# Altium footprint library Connector_Samtec_HLE_THT.PcbLib: 141 footprints (part 2 of 9)
Each footprint in its own frame and in the unit in brackets; x right, y up, seen from the top. Pads: shape width x height; smd on the part's side, far side on the other; paste and mask are expansions set on the pad; w line width, h text height; cw(c..) or ccw(c..) is an arc to the next point about the centre after c.
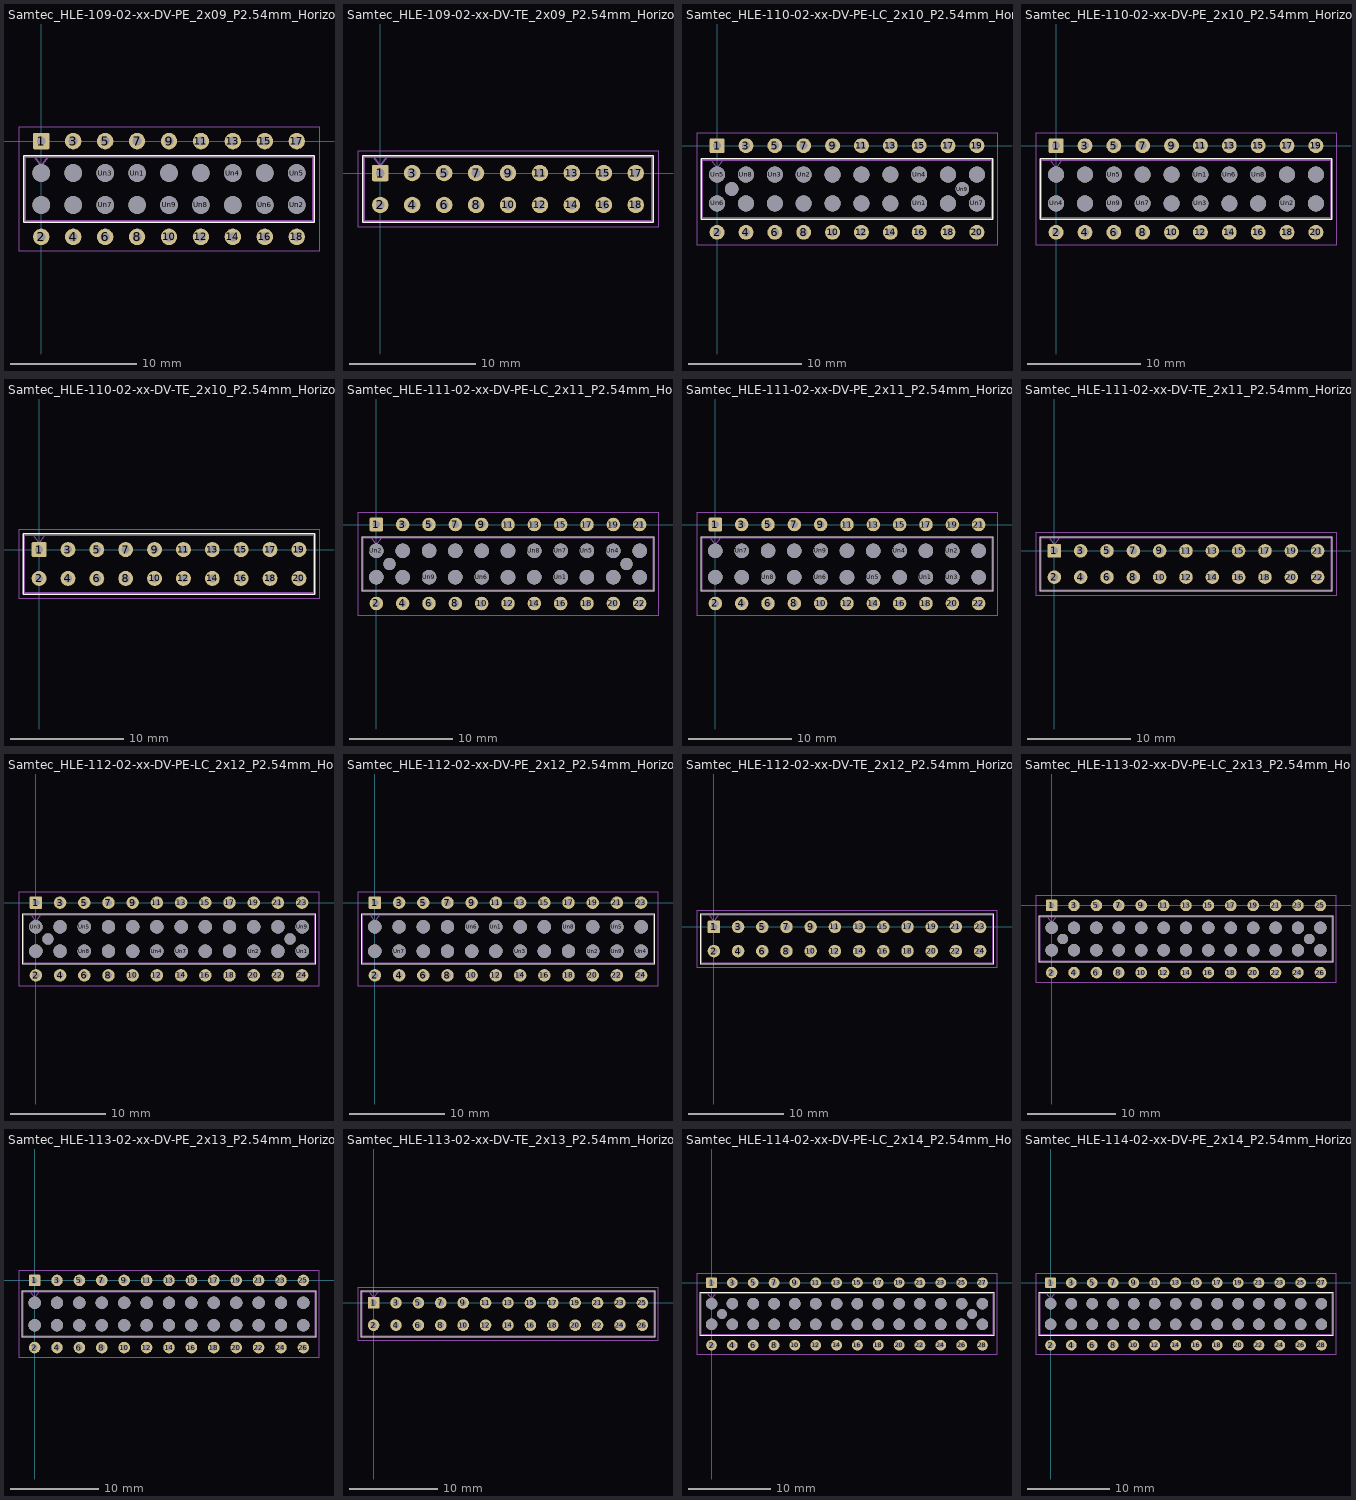
[diagram p1: the footprints below, top view; thin cyan lines are the x and y axes]

## Samtec_HLE-109-02-xx-DV-PE_2x09_P2.54mm_Horizontal [mm]
pads (36):
  rrect19% 1.31x1.31 hole 0.71: 1(0,0)
  round 1.31 hole 0.71: 2(0,-7.62) 3(2.54,0) 4(2.54,-7.62) 5(5.08,0) 6(5.08,-7.62) 7(7.62,0) 8(7.62,-7.62) 9(10.16,0) 10(10.16,-7.62) 11(12.7,0) 12(12.7,-7.62) 13(15.24,0) 14(15.24,-7.62) 15(17.78,0) 16(17.78,-7.62) 17(20.32,0) 18(20.32,-7.62)
  round 1.4 hole 1.4: Un1(7.62,-2.54) Un2(20.32,-5.08) Un3(5.08,-2.54) Un4(15.24,-2.54) Un5(20.32,-2.54) Un6(17.78,-5.08) Un7(5.08,-5.08) Un8(12.7,-5.08) Un9(10.16,-5.08) Un10(17.78,-2.54) Un11(2.54,-5.08) Un12(7.62,-5.08) Un13(2.54,-2.54) Un14(10.16,-2.54) Un15(12.7,-2.54) Un16(0,-2.54) Un17(0,-5.08) Un18(15.24,-5.08)
F.SilkS:
  lines w0.12: -1.38,-6.46 -1.38,-1.16 21.7,-1.16 21.7,-6.46 -1.38,-6.46
F.CrtYd:
  lines w0.05: -1.77,-8.78 22.09,-8.78 22.09,1.16 -1.77,1.16 -1.77,-8.78
F.Fab:
  lines w0.1: -0.5,-1.27 0,-1.977 0.5,-1.27 ; -1.27,-6.35 -1.27,-1.27 21.59,-1.27 21.59,-6.35 -1.27,-6.35
  text "'.Designator'" at 6.113,-6.49 h1

## Samtec_HLE-109-02-xx-DV-TE_2x09_P2.54mm_Horizontal [mm]
pads (18):
  rrect19% 1.31x1.31 hole 0.71: 1(0,0)
  round 1.31 hole 0.71: 2(0,-2.54) 3(2.54,0) 4(2.54,-2.54) 5(5.08,0) 6(5.08,-2.54) 7(7.62,0) 8(7.62,-2.54) 9(10.16,0) 10(10.16,-2.54) 11(12.7,0) 12(12.7,-2.54) 13(15.24,0) 14(15.24,-2.54) 15(17.78,0) 16(17.78,-2.54) 17(20.32,0) 18(20.32,-2.54)
F.SilkS:
  lines w0.12: -1.38,-3.92 21.7,-3.92 21.7,1.38 -1.38,1.38 -1.38,-3.92
F.CrtYd:
  lines w0.05: -1.77,-4.31 22.09,-4.31 22.09,1.77 -1.77,1.77 -1.77,-4.31
F.Fab:
  lines w0.1: -0.5,1.27 0,0.563 0.5,1.27 ; -1.27,-3.81 -1.27,1.27 21.59,1.27 21.59,-3.81 -1.27,-3.81
  text "'.Designator'" at 6.113,-3.95 h1

## Samtec_HLE-110-02-xx-DV-PE-LC_2x10_P2.54mm_Horizontal [mm]
pads (42):
  rrect19% 1.31x1.31 hole 0.71: 1(0,0)
  round 1.31 hole 0.71: 2(0,-7.62) 3(2.54,0) 4(2.54,-7.62) 5(5.08,0) 6(5.08,-7.62) 7(7.62,0) 8(7.62,-7.62) 9(10.16,0) 10(10.16,-7.62) 11(12.7,0) 12(12.7,-7.62) 13(15.24,0) 14(15.24,-7.62) 15(17.78,0) 16(17.78,-7.62) 17(20.32,0) 18(20.32,-7.62) 19(22.86,0) 20(22.86,-7.62)
  round 1.4 hole 1.4: Un1(17.78,-5.08) Un2(7.62,-2.54) Un3(5.08,-2.54) Un4(17.78,-2.54) Un5(0,-2.54) Un6(0,-5.08) Un7(22.86,-5.08) Un8(2.54,-2.54) Un10(12.7,-5.08) Un11(20.32,-2.54) Un12(20.32,-5.08) Un13(22.86,-2.54) Un14(10.16,-2.54) Un16(5.08,-5.08) Un17(15.24,-5.08) Un18(15.24,-2.54) Un19(7.62,-5.08) Un20(2.54,-5.08) Un21(12.7,-2.54) Un22(10.16,-5.08)
  round 1.19 hole 1.19: Un9(21.59,-3.81) Un15(1.27,-3.81)
F.SilkS:
  lines w0.12: -1.38,-6.46 -1.38,-1.16 24.24,-1.16 24.24,-6.46 -1.38,-6.46
F.CrtYd:
  lines w0.05: -1.77,-8.78 -1.77,1.16 24.63,1.16 24.63,-8.78 -1.77,-8.78
F.Fab:
  lines w0.1: -0.5,-1.27 0,-1.977 0.5,-1.27 ; -1.27,-6.35 24.13,-6.35 24.13,-1.27 -1.27,-1.27 -1.27,-6.35
  text "'.Designator'" at 7.383,-6.49 h1

## Samtec_HLE-110-02-xx-DV-PE_2x10_P2.54mm_Horizontal [mm]
pads (40):
  rrect19% 1.31x1.31 hole 0.71: 1(0,0)
  round 1.31 hole 0.71: 2(0,-7.62) 3(2.54,0) 4(2.54,-7.62) 5(5.08,0) 6(5.08,-7.62) 7(7.62,0) 8(7.62,-7.62) 9(10.16,0) 10(10.16,-7.62) 11(12.7,0) 12(12.7,-7.62) 13(15.24,0) 14(15.24,-7.62) 15(17.78,0) 16(17.78,-7.62) 17(20.32,0) 18(20.32,-7.62) 19(22.86,0) 20(22.86,-7.62)
  round 1.4 hole 1.4: Un1(12.7,-2.54) Un2(20.32,-5.08) Un3(12.7,-5.08) Un4(0,-5.08) Un5(5.08,-2.54) Un6(15.24,-2.54) Un7(7.62,-5.08) Un8(17.78,-2.54) Un9(5.08,-5.08) Un10(10.16,-5.08) Un11(7.62,-2.54) Un12(22.86,-2.54) Un13(22.86,-5.08) Un14(0,-2.54) Un15(17.78,-5.08) Un16(15.24,-5.08) Un17(20.32,-2.54) Un18(10.16,-2.54) Un19(2.54,-2.54) Un20(2.54,-5.08)
F.SilkS:
  lines w0.12: -1.38,-6.46 -1.38,-1.16 24.24,-1.16 24.24,-6.46 -1.38,-6.46
F.CrtYd:
  lines w0.05: -1.77,-8.78 -1.77,1.16 24.63,1.16 24.63,-8.78 -1.77,-8.78
F.Fab:
  lines w0.1: -0.5,-1.27 0,-1.977 0.5,-1.27 ; -1.27,-6.35 24.13,-6.35 24.13,-1.27 -1.27,-1.27 -1.27,-6.35
  text "'.Designator'" at 7.383,-6.49 h1

## Samtec_HLE-110-02-xx-DV-TE_2x10_P2.54mm_Horizontal [mm]
pads (20):
  rrect19% 1.31x1.31 hole 0.71: 1(0,0)
  round 1.31 hole 0.71: 2(0,-2.54) 3(2.54,0) 4(2.54,-2.54) 5(5.08,0) 6(5.08,-2.54) 7(7.62,0) 8(7.62,-2.54) 9(10.16,0) 10(10.16,-2.54) 11(12.7,0) 12(12.7,-2.54) 13(15.24,0) 14(15.24,-2.54) 15(17.78,0) 16(17.78,-2.54) 17(20.32,0) 18(20.32,-2.54) 19(22.86,0) 20(22.86,-2.54)
F.SilkS:
  lines w0.12: -1.38,-3.92 24.24,-3.92 24.24,1.38 -1.38,1.38 -1.38,-3.92
F.CrtYd:
  lines w0.05: -1.77,-4.31 -1.77,1.77 24.63,1.77 24.63,-4.31 -1.77,-4.31
F.Fab:
  lines w0.1: -0.5,1.27 0,0.563 0.5,1.27 ; -1.27,-3.81 -1.27,1.27 24.13,1.27 24.13,-3.81 -1.27,-3.81
  text "'.Designator'" at 7.383,-3.95 h1

## Samtec_HLE-111-02-xx-DV-PE-LC_2x11_P2.54mm_Horizontal [mm]
pads (46):
  rrect19% 1.31x1.31 hole 0.71: 1(0,0)
  round 1.31 hole 0.71: 2(0,-7.62) 3(2.54,0) 4(2.54,-7.62) 5(5.08,0) 6(5.08,-7.62) 7(7.62,0) 8(7.62,-7.62) 9(10.16,0) 10(10.16,-7.62) 11(12.7,0) 12(12.7,-7.62) 13(15.24,0) 14(15.24,-7.62) 15(17.78,0) 16(17.78,-7.62) 17(20.32,0) 18(20.32,-7.62) 19(22.86,0) 20(22.86,-7.62) 21(25.4,0) 22(25.4,-7.62)
  round 1.4 hole 1.4: Un1(17.78,-5.08) Un2(0,-2.54) Un4(22.86,-2.54) Un5(20.32,-2.54) Un6(10.16,-5.08) Un7(17.78,-2.54) Un8(15.24,-2.54) Un9(5.08,-5.08) Un10(0,-5.08) Un12(25.4,-5.08) Un13(12.7,-2.54) Un14(22.86,-5.08) Un15(25.4,-2.54) Un16(5.08,-2.54) Un17(2.54,-5.08) Un18(12.7,-5.08) Un19(10.16,-2.54) Un20(7.62,-2.54) Un21(7.62,-5.08) Un22(15.24,-5.08) Un23(20.32,-5.08) Un24(2.54,-2.54)
  round 1.19 hole 1.19: Un3(24.13,-3.81) Un11(1.27,-3.81)
F.SilkS:
  lines w0.12: -1.38,-6.46 26.78,-6.46 26.78,-1.16 -1.38,-1.16 -1.38,-6.46
F.CrtYd:
  lines w0.05: -1.77,-8.78 -1.77,1.16 27.17,1.16 27.17,-8.78 -1.77,-8.78
F.Fab:
  lines w0.1: -0.5,-1.27 0,-1.977 0.5,-1.27 ; -1.27,-6.35 -1.27,-1.27 26.67,-1.27 26.67,-6.35 -1.27,-6.35
  text "'.Designator'" at 8.653,-6.49 h1

## Samtec_HLE-111-02-xx-DV-PE_2x11_P2.54mm_Horizontal [mm]
pads (44):
  rrect19% 1.31x1.31 hole 0.71: 1(0,0)
  round 1.31 hole 0.71: 2(0,-7.62) 3(2.54,0) 4(2.54,-7.62) 5(5.08,0) 6(5.08,-7.62) 7(7.62,0) 8(7.62,-7.62) 9(10.16,0) 10(10.16,-7.62) 11(12.7,0) 12(12.7,-7.62) 13(15.24,0) 14(15.24,-7.62) 15(17.78,0) 16(17.78,-7.62) 17(20.32,0) 18(20.32,-7.62) 19(22.86,0) 20(22.86,-7.62) 21(25.4,0) 22(25.4,-7.62)
  round 1.4 hole 1.4: Un1(20.32,-5.08) Un2(22.86,-2.54) Un3(22.86,-5.08) Un4(17.78,-2.54) Un5(15.24,-5.08) Un6(10.16,-5.08) Un7(2.54,-2.54) Un8(5.08,-5.08) Un9(10.16,-2.54) Un10(7.62,-5.08) Un11(7.62,-2.54) Un12(0,-2.54) Un13(2.54,-5.08) Un14(12.7,-2.54) Un15(5.08,-2.54) Un16(12.7,-5.08) Un17(0,-5.08) Un18(25.4,-2.54) Un19(15.24,-2.54) Un20(20.32,-2.54) Un21(17.78,-5.08) Un22(25.4,-5.08)
F.SilkS:
  lines w0.12: -1.38,-6.46 -1.38,-1.16 26.78,-1.16 26.78,-6.46 -1.38,-6.46
F.CrtYd:
  lines w0.05: -1.77,-8.78 27.17,-8.78 27.17,1.16 -1.77,1.16 -1.77,-8.78
F.Fab:
  lines w0.1: -0.5,-1.27 0,-1.977 0.5,-1.27 ; -1.27,-6.35 -1.27,-1.27 26.67,-1.27 26.67,-6.35 -1.27,-6.35
  text "'.Designator'" at 8.653,-6.49 h1

## Samtec_HLE-111-02-xx-DV-TE_2x11_P2.54mm_Horizontal [mm]
pads (22):
  rrect19% 1.31x1.31 hole 0.71: 1(0,0)
  round 1.31 hole 0.71: 2(0,-2.54) 3(2.54,0) 4(2.54,-2.54) 5(5.08,0) 6(5.08,-2.54) 7(7.62,0) 8(7.62,-2.54) 9(10.16,0) 10(10.16,-2.54) 11(12.7,0) 12(12.7,-2.54) 13(15.24,0) 14(15.24,-2.54) 15(17.78,0) 16(17.78,-2.54) 17(20.32,0) 18(20.32,-2.54) 19(22.86,0) 20(22.86,-2.54) 21(25.4,0) 22(25.4,-2.54)
F.SilkS:
  lines w0.12: -1.38,-3.92 -1.38,1.38 26.78,1.38 26.78,-3.92 -1.38,-3.92
F.CrtYd:
  lines w0.05: -1.77,-4.31 27.17,-4.31 27.17,1.77 -1.77,1.77 -1.77,-4.31
F.Fab:
  lines w0.1: -0.5,1.27 0,0.563 0.5,1.27 ; -1.27,-3.81 -1.27,1.27 26.67,1.27 26.67,-3.81 -1.27,-3.81
  text "'.Designator'" at 8.653,-3.95 h1

## Samtec_HLE-112-02-xx-DV-PE-LC_2x12_P2.54mm_Horizontal [mm]
pads (50):
  rrect19% 1.31x1.31 hole 0.71: 1(0,0)
  round 1.31 hole 0.71: 2(0,-7.62) 3(2.54,0) 4(2.54,-7.62) 5(5.08,0) 6(5.08,-7.62) 7(7.62,0) 8(7.62,-7.62) 9(10.16,0) 10(10.16,-7.62) 11(12.7,0) 12(12.7,-7.62) 13(15.24,0) 14(15.24,-7.62) 15(17.78,0) 16(17.78,-7.62) 17(20.32,0) 18(20.32,-7.62) 19(22.86,0) 20(22.86,-7.62) 21(25.4,0) 22(25.4,-7.62) 23(27.94,0) 24(27.94,-7.62)
  round 1.4 hole 1.4: Un1(27.94,-5.08) Un2(22.86,-5.08) Un3(0,-2.54) Un4(12.7,-5.08) Un5(5.08,-2.54) Un7(15.24,-5.08) Un8(5.08,-5.08) Un9(27.94,-2.54) Un10(7.62,-5.08) Un11(0,-5.08) Un12(25.4,-5.08) Un14(2.54,-2.54) Un15(20.32,-5.08) Un16(17.78,-5.08) Un17(2.54,-5.08) Un18(7.62,-2.54) Un19(25.4,-2.54) Un20(10.16,-2.54) Un21(12.7,-2.54) Un22(15.24,-2.54) Un23(17.78,-2.54) Un24(10.16,-5.08) Un25(20.32,-2.54) Un26(22.86,-2.54)
  round 1.19 hole 1.19: Un6(26.67,-3.81) Un13(1.27,-3.81)
F.SilkS:
  lines w0.12: -1.38,-6.46 29.32,-6.46 29.32,-1.16 -1.38,-1.16 -1.38,-6.46
F.CrtYd:
  lines w0.05: -1.77,-8.78 -1.77,1.16 29.71,1.16 29.71,-8.78 -1.77,-8.78
F.Fab:
  lines w0.1: -0.5,-1.27 0,-1.977 0.5,-1.27 ; -1.27,-6.35 -1.27,-1.27 29.21,-1.27 29.21,-6.35 -1.27,-6.35
  text "'.Designator'" at 9.923,-6.49 h1

## Samtec_HLE-112-02-xx-DV-PE_2x12_P2.54mm_Horizontal [mm]
pads (48):
  rrect19% 1.31x1.31 hole 0.71: 1(0,0)
  round 1.31 hole 0.71: 2(0,-7.62) 3(2.54,0) 4(2.54,-7.62) 5(5.08,0) 6(5.08,-7.62) 7(7.62,0) 8(7.62,-7.62) 9(10.16,0) 10(10.16,-7.62) 11(12.7,0) 12(12.7,-7.62) 13(15.24,0) 14(15.24,-7.62) 15(17.78,0) 16(17.78,-7.62) 17(20.32,0) 18(20.32,-7.62) 19(22.86,0) 20(22.86,-7.62) 21(25.4,0) 22(25.4,-7.62) 23(27.94,0) 24(27.94,-7.62)
  round 1.4 hole 1.4: Un1(12.7,-2.54) Un2(22.86,-5.08) Un3(15.24,-5.08) Un4(27.94,-5.08) Un5(25.4,-2.54) Un6(10.16,-2.54) Un7(2.54,-5.08) Un8(20.32,-2.54) Un9(25.4,-5.08) Un10(5.08,-5.08) Un11(10.16,-5.08) Un12(0,-2.54) Un13(0,-5.08) Un14(17.78,-2.54) Un15(27.94,-2.54) Un16(5.08,-2.54) Un17(20.32,-5.08) Un18(7.62,-2.54) Un19(15.24,-2.54) Un20(7.62,-5.08) Un21(22.86,-2.54) Un22(2.54,-2.54) Un23(12.7,-5.08) Un24(17.78,-5.08)
F.SilkS:
  lines w0.12: -1.38,-6.46 -1.38,-1.16 29.32,-1.16 29.32,-6.46 -1.38,-6.46
F.CrtYd:
  lines w0.05: -1.77,-8.78 29.71,-8.78 29.71,1.16 -1.77,1.16 -1.77,-8.78
F.Fab:
  lines w0.1: -0.5,-1.27 0,-1.977 0.5,-1.27 ; -1.27,-6.35 29.21,-6.35 29.21,-1.27 -1.27,-1.27 -1.27,-6.35
  text "'.Designator'" at 9.923,-6.49 h1

## Samtec_HLE-112-02-xx-DV-TE_2x12_P2.54mm_Horizontal [mm]
pads (24):
  rrect19% 1.31x1.31 hole 0.71: 1(0,0)
  round 1.31 hole 0.71: 2(0,-2.54) 3(2.54,0) 4(2.54,-2.54) 5(5.08,0) 6(5.08,-2.54) 7(7.62,0) 8(7.62,-2.54) 9(10.16,0) 10(10.16,-2.54) 11(12.7,0) 12(12.7,-2.54) 13(15.24,0) 14(15.24,-2.54) 15(17.78,0) 16(17.78,-2.54) 17(20.32,0) 18(20.32,-2.54) 19(22.86,0) 20(22.86,-2.54) 21(25.4,0) 22(25.4,-2.54) 23(27.94,0) 24(27.94,-2.54)
F.SilkS:
  lines w0.12: -1.38,-3.92 29.32,-3.92 29.32,1.38 -1.38,1.38 -1.38,-3.92
F.CrtYd:
  lines w0.05: -1.77,-4.31 -1.77,1.77 29.71,1.77 29.71,-4.31 -1.77,-4.31
F.Fab:
  lines w0.1: -0.5,1.27 0,0.563 0.5,1.27 ; -1.27,-3.81 29.21,-3.81 29.21,1.27 -1.27,1.27 -1.27,-3.81
  text "'.Designator'" at 9.923,-3.95 h1

## Samtec_HLE-113-02-xx-DV-PE-LC_2x13_P2.54mm_Horizontal [mm]
pads (54):
  rrect19% 1.31x1.31 hole 0.71: 1(0,0)
  round 1.31 hole 0.71: 2(0,-7.62) 3(2.54,0) 4(2.54,-7.62) 5(5.08,0) 6(5.08,-7.62) 7(7.62,0) 8(7.62,-7.62) 9(10.16,0) 10(10.16,-7.62) 11(12.7,0) 12(12.7,-7.62) 13(15.24,0) 14(15.24,-7.62) 15(17.78,0) 16(17.78,-7.62) 17(20.32,0) 18(20.32,-7.62) 19(22.86,0) 20(22.86,-7.62) 21(25.4,0) 22(25.4,-7.62) 23(27.94,0) 24(27.94,-7.62) 25(30.48,0) 26(30.48,-7.62)
  round 1.19 hole 1.19: Un1(29.21,-3.81) Un22(1.27,-3.81)
  round 1.4 hole 1.4: Un2(25.4,-5.08) Un3(10.16,-2.54) Un4(15.24,-5.08) Un5(5.08,-5.08) Un6(7.62,-5.08) Un7(12.7,-2.54) Un8(22.86,-5.08) Un9(2.54,-2.54) Un10(27.94,-2.54) Un11(0,-2.54) Un12(25.4,-2.54) Un13(30.48,-5.08) Un14(12.7,-5.08) Un15(30.48,-2.54) Un16(17.78,-2.54) Un17(22.86,-2.54) Un18(20.32,-2.54) Un19(7.62,-2.54) Un20(5.08,-2.54) Un21(0,-5.08) Un23(10.16,-5.08) Un24(17.78,-5.08) Un25(2.54,-5.08) Un26(20.32,-5.08) Un27(15.24,-2.54) Un28(27.94,-5.08)
F.SilkS:
  lines w0.12: -1.38,-6.46 31.86,-6.46 31.86,-1.16 -1.38,-1.16 -1.38,-6.46
F.CrtYd:
  lines w0.05: -1.77,-8.78 32.25,-8.78 32.25,1.16 -1.77,1.16 -1.77,-8.78
F.Fab:
  lines w0.1: -0.5,-1.27 0,-1.977 0.5,-1.27 ; -1.27,-6.35 -1.27,-1.27 31.75,-1.27 31.75,-6.35 -1.27,-6.35
  text "'.Designator'" at 11.193,-6.49 h1

## Samtec_HLE-113-02-xx-DV-PE_2x13_P2.54mm_Horizontal [mm]
pads (52):
  rrect19% 1.31x1.31 hole 0.71: 1(0,0)
  round 1.31 hole 0.71: 2(0,-7.62) 3(2.54,0) 4(2.54,-7.62) 5(5.08,0) 6(5.08,-7.62) 7(7.62,0) 8(7.62,-7.62) 9(10.16,0) 10(10.16,-7.62) 11(12.7,0) 12(12.7,-7.62) 13(15.24,0) 14(15.24,-7.62) 15(17.78,0) 16(17.78,-7.62) 17(20.32,0) 18(20.32,-7.62) 19(22.86,0) 20(22.86,-7.62) 21(25.4,0) 22(25.4,-7.62) 23(27.94,0) 24(27.94,-7.62) 25(30.48,0) 26(30.48,-7.62)
  round 1.4 hole 1.4: Un1(5.08,-5.08) Un2(2.54,-2.54) Un3(12.7,-2.54) Un4(15.24,-5.08) Un5(30.48,-5.08) Un6(27.94,-5.08) Un7(12.7,-5.08) Un8(25.4,-5.08) Un9(25.4,-2.54) Un10(0,-5.08) Un11(20.32,-2.54) Un12(15.24,-2.54) Un13(7.62,-2.54) Un14(30.48,-2.54) Un15(17.78,-5.08) Un16(20.32,-5.08) Un17(22.86,-2.54) Un18(10.16,-2.54) Un19(10.16,-5.08) Un20(17.78,-2.54) Un21(27.94,-2.54) Un22(5.08,-2.54) Un23(2.54,-5.08) Un24(0,-2.54) Un25(7.62,-5.08) Un26(22.86,-5.08)
F.SilkS:
  lines w0.12: -1.38,-6.46 -1.38,-1.16 31.86,-1.16 31.86,-6.46 -1.38,-6.46
F.CrtYd:
  lines w0.05: -1.77,-8.78 -1.77,1.16 32.25,1.16 32.25,-8.78 -1.77,-8.78
F.Fab:
  lines w0.1: -0.5,-1.27 0,-1.977 0.5,-1.27 ; -1.27,-6.35 -1.27,-1.27 31.75,-1.27 31.75,-6.35 -1.27,-6.35
  text "'.Designator'" at 11.193,-6.49 h1

## Samtec_HLE-113-02-xx-DV-TE_2x13_P2.54mm_Horizontal [mm]
pads (26):
  rrect19% 1.31x1.31 hole 0.71: 1(0,0)
  round 1.31 hole 0.71: 2(0,-2.54) 3(2.54,0) 4(2.54,-2.54) 5(5.08,0) 6(5.08,-2.54) 7(7.62,0) 8(7.62,-2.54) 9(10.16,0) 10(10.16,-2.54) 11(12.7,0) 12(12.7,-2.54) 13(15.24,0) 14(15.24,-2.54) 15(17.78,0) 16(17.78,-2.54) 17(20.32,0) 18(20.32,-2.54) 19(22.86,0) 20(22.86,-2.54) 21(25.4,0) 22(25.4,-2.54) 23(27.94,0) 24(27.94,-2.54) 25(30.48,0) 26(30.48,-2.54)
F.SilkS:
  lines w0.12: -1.38,-3.92 -1.38,1.38 31.86,1.38 31.86,-3.92 -1.38,-3.92
F.CrtYd:
  lines w0.05: -1.77,-4.31 -1.77,1.77 32.25,1.77 32.25,-4.31 -1.77,-4.31
F.Fab:
  lines w0.1: -0.5,1.27 0,0.563 0.5,1.27 ; -1.27,-3.81 -1.27,1.27 31.75,1.27 31.75,-3.81 -1.27,-3.81
  text "'.Designator'" at 11.193,-3.95 h1

## Samtec_HLE-114-02-xx-DV-PE-LC_2x14_P2.54mm_Horizontal [mm]
pads (58):
  rrect19% 1.31x1.31 hole 0.71: 1(0,0)
  round 1.31 hole 0.71: 2(0,-7.62) 3(2.54,0) 4(2.54,-7.62) 5(5.08,0) 6(5.08,-7.62) 7(7.62,0) 8(7.62,-7.62) 9(10.16,0) 10(10.16,-7.62) 11(12.7,0) 12(12.7,-7.62) 13(15.24,0) 14(15.24,-7.62) 15(17.78,0) 16(17.78,-7.62) 17(20.32,0) 18(20.32,-7.62) 19(22.86,0) 20(22.86,-7.62) 21(25.4,0) 22(25.4,-7.62) 23(27.94,0) 24(27.94,-7.62) 25(30.48,0) 26(30.48,-7.62) 27(33.02,0) 28(33.02,-7.62)
  round 1.4 hole 1.4: Un1(22.86,-2.54) Un2(33.02,-5.08) Un3(12.7,-2.54) Un4(17.78,-5.08) Un5(0,-5.08) Un6(7.62,-2.54) Un8(33.02,-2.54) Un9(22.86,-5.08) Un10(25.4,-5.08) Un11(30.48,-5.08) Un12(15.24,-5.08) Un14(27.94,-5.08) Un15(15.24,-2.54) Un16(2.54,-5.08) Un17(25.4,-2.54) Un18(30.48,-2.54) Un19(5.08,-2.54) Un20(10.16,-2.54) Un21(12.7,-5.08) Un22(7.62,-5.08) Un23(20.32,-5.08) Un24(0,-2.54) Un25(20.32,-2.54) Un26(10.16,-5.08) Un27(17.78,-2.54) Un28(27.94,-2.54) Un29(2.54,-2.54) Un30(5.08,-5.08)
  round 1.19 hole 1.19: Un7(31.75,-3.81) Un13(1.27,-3.81)
F.SilkS:
  lines w0.12: -1.38,-6.46 -1.38,-1.16 34.4,-1.16 34.4,-6.46 -1.38,-6.46
F.CrtYd:
  lines w0.05: -1.77,-8.78 34.79,-8.78 34.79,1.16 -1.77,1.16 -1.77,-8.78
F.Fab:
  lines w0.1: -0.5,-1.27 0,-1.977 0.5,-1.27 ; -1.27,-6.35 34.29,-6.35 34.29,-1.27 -1.27,-1.27 -1.27,-6.35
  text "'.Designator'" at 12.463,-6.49 h1

## Samtec_HLE-114-02-xx-DV-PE_2x14_P2.54mm_Horizontal [mm]
pads (56):
  rrect19% 1.31x1.31 hole 0.71: 1(0,0)
  round 1.31 hole 0.71: 2(0,-7.62) 3(2.54,0) 4(2.54,-7.62) 5(5.08,0) 6(5.08,-7.62) 7(7.62,0) 8(7.62,-7.62) 9(10.16,0) 10(10.16,-7.62) 11(12.7,0) 12(12.7,-7.62) 13(15.24,0) 14(15.24,-7.62) 15(17.78,0) 16(17.78,-7.62) 17(20.32,0) 18(20.32,-7.62) 19(22.86,0) 20(22.86,-7.62) 21(25.4,0) 22(25.4,-7.62) 23(27.94,0) 24(27.94,-7.62) 25(30.48,0) 26(30.48,-7.62) 27(33.02,0) 28(33.02,-7.62)
  round 1.4 hole 1.4: Un1(20.32,-5.08) Un2(12.7,-5.08) Un3(30.48,-5.08) Un4(7.62,-5.08) Un5(33.02,-2.54) Un6(17.78,-2.54) Un7(5.08,-2.54) Un8(33.02,-5.08) Un9(22.86,-2.54) Un10(30.48,-2.54) Un11(2.54,-5.08) Un12(10.16,-2.54) Un13(15.24,-2.54) Un14(25.4,-5.08) Un15(27.94,-5.08) Un16(27.94,-2.54) Un17(5.08,-5.08) Un18(12.7,-2.54) Un19(7.62,-2.54) Un20(15.24,-5.08) Un21(2.54,-2.54) Un22(17.78,-5.08) Un23(22.86,-5.08) Un24(10.16,-5.08) Un25(20.32,-2.54) Un26(25.4,-2.54) Un27(0,-5.08) Un28(0,-2.54)
F.SilkS:
  lines w0.12: -1.38,-6.46 -1.38,-1.16 34.4,-1.16 34.4,-6.46 -1.38,-6.46
F.CrtYd:
  lines w0.05: -1.77,-8.78 34.79,-8.78 34.79,1.16 -1.77,1.16 -1.77,-8.78
F.Fab:
  lines w0.1: -0.5,-1.27 0,-1.977 0.5,-1.27 ; -1.27,-6.35 34.29,-6.35 34.29,-1.27 -1.27,-1.27 -1.27,-6.35
  text "'.Designator'" at 12.463,-6.49 h1